# Altium footprint library SensorCard.PcbLib: 61 footprints (part 2 of 4)
Each footprint in its own frame and in the unit in brackets; x right, y up, seen from the top. Pads: shape width x height; smd on the part's side, far side on the other; paste and mask are expansions set on the pad; w line width, h text height; cw(c..) or ccw(c..) is an arc to the next point about the centre after c.
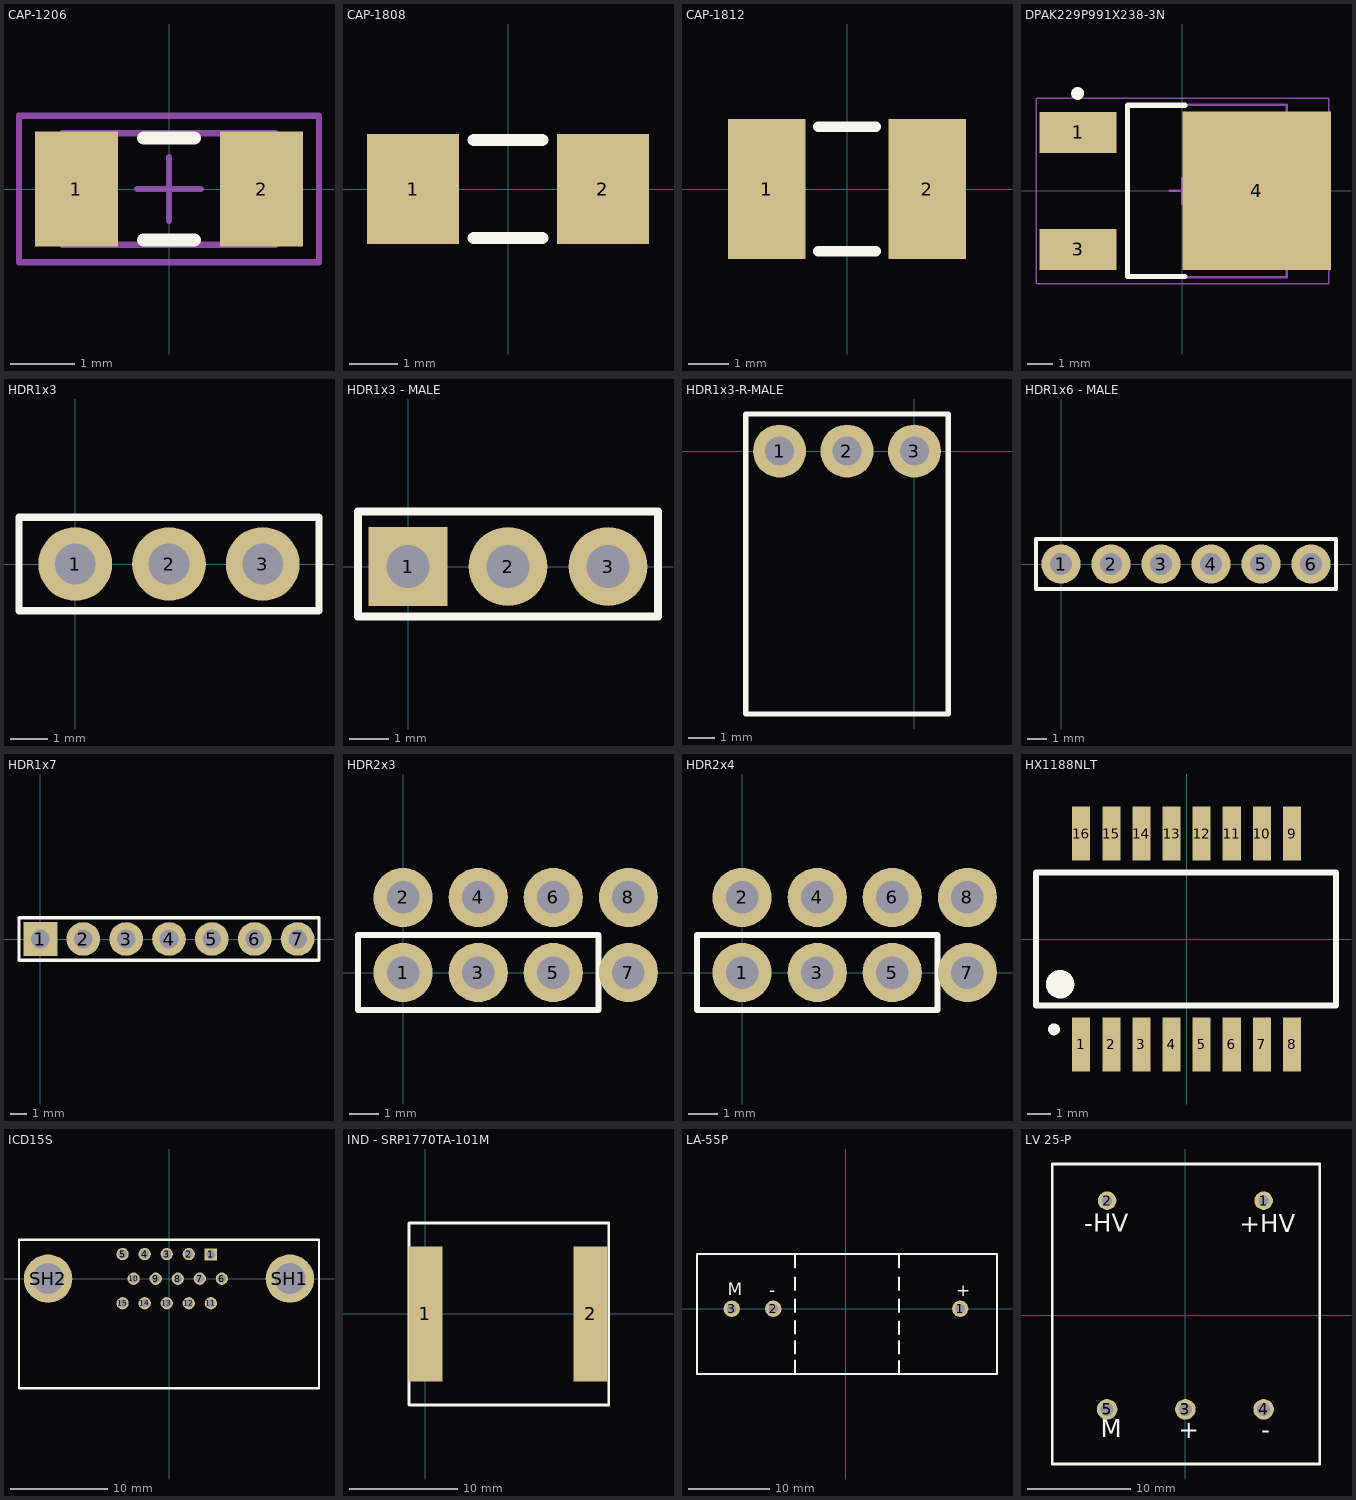
[diagram p1: the footprints below, top view; thin cyan lines are the x and y axes]

## CAP-1206 [mm] "Chip Capacitor Body 3.2x1.6mm, IPC Medium Density"
height 0.71
pads (2):
  rect 1.3x1.8 smd: 1(-1.45,0) 2(1.45,0)
Top Overlay:
  lines w0.2: -0.4,-0.8 0.4,-0.8 ; -0.4,0.8 0.4,0.8
Mechanical 13:
  lines w0.1: -1.675,-0.875 -1.675,0.875 1.675,0.875 1.675,-0.875 -1.675,-0.875
Mechanical 15:
  lines w0.1: -0.5,0 0.5,0 ; 0,-0.5 0,0.5 ; -2.35,-1.15 -2.35,1.15 2.35,1.15 2.35,-1.15 -2.35,-1.15
3D body "User Library-Vhip cap 1206.step": height 1.7, standoff 0, extent -1.6,-0.87 1.6,0.87

## CAP-1808 [mil]
pads (2):
  rect 75x90 smd: 1(-77.48,0) 2(77.48,0)
Top Overlay:
  lines w10: -28,-40 28,-40 ; -28,40 28,40

## CAP-1812 [mil]
pads (2):
  rect 75x135 smd: 1(-77.48,0) 2(77.48,0)
Top Overlay:
  lines w10: -28,-60 28,-60 ; -28,60 28,60

## DPAK229P991X238-3N [mm] "D-PAK, 3-Pads, Body 6.21x6.73mm (max), IPC Medium Density"
height 2.38
pads (3):
  rect 3x1.6 smd: 1(-4.08,2.285) 3(-4.08,-2.285)
  rect 5.8x6.2 smd: 4(2.9,0)
Top Overlay:
  circle w0.25: c-4.1,3.81 r0.125
  lines w0.2: 0.1,-3.35 -2.15,-3.35 -2.15,3.35 0.1,3.35
Mechanical 13:
  lines w0.1: -2.15,-3.375 4.07,-3.375 4.07,3.375 -2.15,3.375 -2.15,-3.375
Mechanical 15:
  lines w0.05: -5.725,-3.625 5.725,-3.625 5.725,3.625 -5.725,3.625 -5.725,-3.625
  lines w0.1: -0.5,0 0.5,0 ; 0,-0.5 0,0.5
3D body "DPAK229P991X238-3N.step": height 2.38, standoff 0, extent -5.162,-3.375 4.753,3.375

## HDR1x3 [mm]
pads (3):
  round 2 hole 1.1: 1(0,0) 2(2.54,0) 3(5.08,0)
Top Overlay:
  lines w0.2: -1.524,-1.27 -1.524,1.27 6.604,1.27 6.604,-1.27 -1.524,-1.27
3D body "c-215299-3-e-3d.stp": height 8.5, standoff -3, extent -1.27,-1.196 6.35,1.324

## HDR1x3 - MALE [mm]
pads (3):
  rect 2x2 hole 1.1: 1(0,0)
  round 2 hole 1.1: 2(2.54,0) 3(5.08,0)
Top Overlay:
  lines w0.2: -1.27,-1.27 -1.27,1.397 6.35,1.397 6.35,-1.27 -1.27,-1.27
3D body "Download_STP_61300311121 (rev1) (1).stp": height 8.77, standoff -2.77, extent -1.27,-1.206 6.35,1.334

## HDR1x3-R-MALE [mm]
pads (3):
  round 2 hole 1.1: 1(-5.08,0) 2(-2.54,0) 3(0,0)
Top Overlay:
  lines w0.2: -6.35,-9.906 1.27,-9.906 1.27,1.397 -6.35,1.397 -6.35,-9.906
3D body "TSW-103-08-F-S-RA.stp": height 1.27, standoff -4.04, extent -6.35,-9.906 1.27,0.318

## HDR1x6 - MALE [mm]
pads (6):
  round 2 hole 1.1: 1(0,0) 2(2.54,0) 3(5.08,0) 4(7.62,0) 5(10.16,0) 6(12.7,0)
Top Overlay:
  lines w0.2: -1.27,-1.27 13.97,-1.27 13.97,1.27 -1.27,1.27 -1.27,-1.27
3D body "Download_STP_61300611121 (rev1) (1).stp": height 8.77, standoff -2.77, extent -1.27,-1.26 13.97,1.28

## HDR1x7 [mm]
pads (7):
  rect 2x2 hole 1.1: 1(0,0)
  round 2 hole 1.1: 2(2.54,0) 3(5.08,0) 4(7.62,0) 5(10.16,0) 6(12.7,0) 7(15.24,0)
Top Overlay:
  lines w0.2: -1.27,-1.27 16.51,-1.27 16.51,1.27 -1.27,1.27 -1.27,-1.27
3D body "Header7pin.STEP": height 8.54, standoff -3, extent -1.27,-1.245 16.51,1.245

## HDR2x3 [mm]
pads (8):
  round 2 hole 1.1: 1(0,0) 2(0,2.54) 3(2.54,0) 4(2.54,2.54) 5(5.08,0) 6(5.08,2.54) 7(7.62,0) 8(7.62,2.54)
Top Overlay:
  lines w0.2: -1.524,-1.27 6.604,-1.27 6.604,1.27 -1.524,1.27 -1.524,-1.27
3D body "SSW-103-01-F-S.stp": height 8.51, standoff -2.64, extent -1.524,-1.143 6.604,1.27

## HDR2x4 [mm]
pads (8):
  round 2 hole 1.1: 1(0,0) 2(0,2.54) 3(2.54,0) 4(2.54,2.54) 5(5.08,0) 6(5.08,2.54) 7(7.62,0) 8(7.62,2.54)
Top Overlay:
  lines w0.2: -1.524,-1.27 6.604,-1.27 6.604,1.27 -1.524,1.27 -1.524,-1.27
3D body "SSW-103-01-F-S.stp": height 8.51, standoff -2.64, extent -1.524,-1.143 6.604,1.27

## HX1188NLT [mil] "XFRMR MAGNETIC 1PORT 1:1 10/100"
height 236
pads (16):
  rect 30x90 smd: 1(-175,-175) 2(-125,-175) 3(-75,-175) 4(-25,-175) 5(25,-175) 6(75,-175) 7(125,-175) 8(175,-175) 9(175,175) 10(125,175) 11(75,175) 12(25,175) 13(-25,175) 14(-75,175) 15(-125,175) 16(-175,175)
Top Overlay:
  circle w23.62: c-210,-75 r11.81
  circle w9.84: c-220,-150 r4.92
  lines w10: -250,-110 -250,110 248.01,110 248.01,-110 -250,-110
3D body "HX1188NL_3D.STEP": height 235, standoff 0, extent -250,-181.06 250,188.93

## ICD15S [mm] "CONN DSUB HD RCPT 15POS R/A SLDR"
pads (17):
  rect 1.27x1.27 hole 0.9: 1(4.305,2.5)
  round 1.27 hole 0.9: 2(2.045,2.54) 3(-0.235,2.54) 4(-2.515,2.54) 5(-4.795,2.54) 6(5.465,0) 7(3.185,0) 8(0.905,0) 9(-1.375,0) 10(-3.655,0) 11(4.325,-2.54) 12(2.045,-2.54) 13(-0.235,-2.54) 14(-2.515,-2.54) 15(-4.795,-2.54)
  round 5 hole 3.2: SH1(12.495,0) SH2(-12.495,0)
Top Overlay:
  lines w0.254: -15.5,-11.3 -15.5,4 15.5,4 15.5,-11.3 -15.5,-11.3
3D body "sicd15s13e6gx00lf.stp": height 12.65, standoff -3.1, extent -15.5,-17.58 15.5,4

## IND - SRP1770TA-101M [mm] "FIXED IND 100UH 5.3A 118 MOHM"
pads (2):
  rect 3.15x12.5 smd: 1(0,0) 2(15.35,0)
Top Overlay:
  lines w0.254: -1.524,-8.45 17.018,-8.45 17.018,8.45 -1.524,8.45 -1.524,-8.382
3D body "SRP1770TA.stp": height 6.81, standoff 0, extent -1.27,-8.45 16.63,8.45

## LA-55P [mm] "Current sensor footprint"
pads (3):
  round 2 hole 1.2: 1(13.97,0.01) 2(-8.89,0) 3(-13.97,0)
Top Overlay:
  lines w0.254: -18.223,-7.985 18.477,-7.985 18.477,6.715 -18.223,6.715 ; -18.223,-7.86 -18.223,6.59 ; -6.223,-7.86 -6.223,-6.35 ; -6.223,-5.461 -6.223,-3.951 ; -6.223,-3.034 -6.223,-1.524 ; -6.223,-0.367 -6.223,1.143 ; -6.223,2.286 -6.223,3.796 ; -6.223,5.08 -6.223,6.59 ; 6.477,-7.874 6.477,-6.364 ; 6.477,-5.461 6.477,-3.951 ; 6.477,-3.048 6.477,-1.538 ; 6.477,-0.381 6.477,1.129 ; 6.477,2.286 6.477,3.796 ; 6.477,5.08 6.477,6.59
  text "+" at 13.462,1.524 h1.52
  text "-" at -9.398,1.524 h1.52
  text "M" at -14.478,1.651 h1.52
3D body "LA55-P_Blackbox.stp": height 28.46, standoff -3.79, extent -18.288,-7.885 18.319,6.615

## LV 25-P [mm] "Voltage sensor footprint"
pads (5):
  round 1.8 hole 1: 1(7.62,11.16) 2(-7.62,11.16)
  round 2 hole 1.25: 3(0,-9.16) 4(7.62,-9.16) 5(-7.62,-9.16)
Top Overlay:
  lines w0.254: -12.954,-14.478 -12.954,14.732 13.081,14.732 13.081,-14.478 -12.954,-14.478
  text "-" at 7.366,-12.573 h3
  text "+" at -0.635,-12.573 h3
  text "M" at -8.255,-12.446 h3
  text "-HV" at -9.85,7.565 h3
  text "+HV" at 5.3,7.515 h3
3D body "User Library-LV25-P_LEM.STEP": height 16.7, standoff -3.05, extent -12.954,-14.473 13.046,14.727